# Altium schematic symbol library jlcpcb_2025_04_inductors_extended_0402.schlib: 1396 symbols (part 3 of 8) (continued)
## LQW15AN2N2B80D
designator L?  Inductance: 2.2nH
Inductor, 2.2nH, 22mΩ, SMD 0402; Manufacturer: Murata Electronics; Manufacturer Part Number: LQW15AN2N2B80D; Self-Resonant Frequency: 15.5GHz; Q Factor: 30@250MHz; Package Size: 0402; JLCPCB Basic Part: No; JLCPCB Part Number: C2041833; Supplier 1: LCSC; Category: Inductors; Supplier Part Number 1: C2041833; DC Resistance: 22mΩ; RoHS: Yes; ComponentLink1Description: Datasheet; ComponentLink1URL: https://wmsc.lcsc.com/wmsc/upload/file/pdf/v2/lcsc/2304140030_Murata-Electronics-LQW15AN2N2B80D_C2041833.pdf; ComponentLink2Description: JLCPCB Part URL; ComponentLink2URL: https://jlcpcb.com/partdetail/C2041833; ComponentLink3Description: LCSC Part URL; ComponentLink3URL: https://lcsc.com/product-detail/Inductors-SMD_Murata-Electronics-Murata-Electronics-LQW15AN2N2B80D_C2041833.html
footprint IND-0402 (0402 (1005M) Inductor)
pins: 1, 2

## LQW15AN2N2C8ZD
designator L?  Inductance: 2.2nH
Inductor, 2.2nH, 22mΩ, SMD 0402; Manufacturer: Murata Electronics; Manufacturer Part Number: LQW15AN2N2C8ZD; Self-Resonant Frequency: 15.5GHz; Q Factor: 30@250MHz; Package Size: 0402; JLCPCB Basic Part: No; JLCPCB Part Number: C883558; Supplier 1: LCSC; Category: Inductors; Supplier Part Number 1: C883558; DC Resistance: 22mΩ; RoHS: Yes; ComponentLink1Description: Datasheet; ComponentLink1URL: https://wmsc.lcsc.com/wmsc/upload/file/pdf/v2/lcsc/2304140030_Murata-Electronics-LQW15AN2N2C8ZD_C883558.pdf; ComponentLink2Description: JLCPCB Part URL; ComponentLink2URL: https://jlcpcb.com/partdetail/C883558; ComponentLink3Description: LCSC Part URL; ComponentLink3URL: https://lcsc.com/product-detail/Inductors-SMD_Murata-Electronics-Murata-Electronics-LQW15AN2N2C8ZD_C883558.html
footprint IND-0402 (0402 (1005M) Inductor)
pins: 1, 2

## LQW15AN2N2C10D
designator L?  Inductance: 2.2nH
Inductor, 2.2nH, 27mΩ, 1A, SMD 0402; Manufacturer: Murata Electronics; Manufacturer Part Number: LQW15AN2N2C10D; Self-Resonant Frequency: 14GHz; Q Factor: 25@250MHz; Package Size: 0402; JLCPCB Basic Part: No; JLCPCB Part Number: C91240; Supplier 1: LCSC; Category: Inductors; Supplier Part Number 1: C91240; Rated Current: 1A; DC Resistance: 27mΩ; RoHS: Yes; ComponentLink1Description: Datasheet; ComponentLink1URL: https://wmsc.lcsc.com/wmsc/upload/file/pdf/v2/lcsc/1811081515_Murata-Electronics-LQW15AN2N2C10D_C91240.pdf; ComponentLink2Description: JLCPCB Part URL; ComponentLink2URL: https://jlcpcb.com/partdetail/C91240; ComponentLink3Description: LCSC Part URL; ComponentLink3URL: https://lcsc.com/product-detail/Inductors-SMD_Murata-Electronics-Murata-Electronics-LQW15AN2N2C10D_C91240.html
footprint IND-0402 (0402 (1005M) Inductor)
pins: 1, 2

## LQW15AN2N2G80D
designator L?  Inductance: 2.2nH
Inductor, 2.2nH, ±2%, 22mΩ, 2.53A, SMD 0402; Manufacturer: Murata Electronics; Manufacturer Part Number: LQW15AN2N2G80D; Self-Resonant Frequency: 15.5GHz; Q Factor: 30@250MHz; Package Size: 0402; JLCPCB Basic Part: No; JLCPCB Part Number: C412264; Supplier 1: LCSC; Category: Inductors; Supplier Part Number 1: C412264; Tolerance: ±2%; Rated Current: 2.53A; DC Resistance: 22mΩ; RoHS: Yes; ComponentLink1Description: Datasheet; ComponentLink1URL: https://wmsc.lcsc.com/wmsc/upload/file/pdf/v2/lcsc/2304140030_Murata-Electronics-LQW15AN2N2G80D_C412264.pdf; ComponentLink2Description: JLCPCB Part URL; ComponentLink2URL: https://jlcpcb.com/partdetail/C412264; ComponentLink3Description: LCSC Part URL; ComponentLink3URL: https://lcsc.com/product-detail/Inductors-SMD_Murata-Electronics-Murata-Electronics-LQW15AN2N2G80D_C412264.html
footprint IND-0402 (0402 (1005M) Inductor)
pins: 1, 2

## LQW15AN2N3C10D
designator L?  Inductance: 2.3nH
Inductor, 2.3nH, 27mΩ, SMD 0402; Manufacturer: Murata Electronics; Manufacturer Part Number: LQW15AN2N3C10D; Self-Resonant Frequency: 14GHz; Q Factor: 25@250MHz; Package Size: 0402; JLCPCB Basic Part: No; JLCPCB Part Number: C412340; Supplier 1: LCSC; Category: Inductors; Supplier Part Number 1: C412340; DC Resistance: 27mΩ; RoHS: Yes; ComponentLink1Description: Datasheet; ComponentLink1URL: https://wmsc.lcsc.com/wmsc/upload/file/pdf/v2/lcsc/2304140030_Murata-Electronics-LQW15AN2N3C10D_C412340.pdf; ComponentLink2Description: JLCPCB Part URL; ComponentLink2URL: https://jlcpcb.com/partdetail/C412340; ComponentLink3Description: LCSC Part URL; ComponentLink3URL: https://lcsc.com/product-detail/Inductors-SMD_Murata-Electronics-Murata-Electronics-LQW15AN2N3C10D_C412340.html
footprint IND-0402 (0402 (1005M) Inductor)
pins: 1, 2

## LQW15AN2N4B00D
designator L?  Inductance: 2.4nH
Inductor, 2.4nH, 50mΩ, SMD 0402; Manufacturer: Murata Electronics; Manufacturer Part Number: LQW15AN2N4B00D; Self-Resonant Frequency: 15GHz; Q Factor: 20@250MHz; Package Size: 0402; JLCPCB Basic Part: No; JLCPCB Part Number: C113113; Supplier 1: LCSC; Category: Inductors; Supplier Part Number 1: C113113; DC Resistance: 50mΩ; RoHS: Yes; ComponentLink1Description: Datasheet; ComponentLink1URL: https://wmsc.lcsc.com/wmsc/upload/file/pdf/v2/lcsc/2304140030_Murata-Electronics-LQW15AN2N4B00D_C113113.pdf; ComponentLink2Description: JLCPCB Part URL; ComponentLink2URL: https://jlcpcb.com/partdetail/C113113; ComponentLink3Description: LCSC Part URL; ComponentLink3URL: https://lcsc.com/product-detail/Inductors-SMD_Murata-Electronics-Murata-Electronics-LQW15AN2N4B00D_C113113.html
footprint IND-0402 (0402 (1005M) Inductor)
pins: 1, 2

## LQW15AN2N4B80D
designator L?  Inductance: 2.4nH
Inductor, 2.4nH, 22mΩ, 2.53A, SMD 0402; Manufacturer: Murata Electronics; Manufacturer Part Number: LQW15AN2N4B80D; Package Size: 0402; JLCPCB Basic Part: No; JLCPCB Part Number: C3221977; Supplier 1: LCSC; Category: Inductors; Supplier Part Number 1: C3221977; Rated Current: 2.53A; DC Resistance: 22mΩ; RoHS: Yes; ComponentLink1Description: Datasheet; ComponentLink1URL: https://wmsc.lcsc.com/wmsc/upload/file/pdf/v2/lcsc/2308111552_Murata-Electronics-LQW15AN2N4B80D_C3221977.pdf; ComponentLink2Description: JLCPCB Part URL; ComponentLink2URL: https://jlcpcb.com/partdetail/C3221977; ComponentLink3Description: LCSC Part URL; ComponentLink3URL: https://lcsc.com/product-detail/Power-Inductors_Murata-Electronics-Murata-Electronics-LQW15AN2N4B80D_C3221977.html
footprint IND-0402 (0402 (1005M) Inductor)
pins: 1, 2

## LQW15AN2N4C00D
designator L?  Inductance: 2.4nH
Inductor, 2.4nH, 50mΩ, 850mA, SMD 0402; Manufacturer: Murata Electronics; Manufacturer Part Number: LQW15AN2N4C00D; Self-Resonant Frequency: 15GHz; Q Factor: 20@250MHz; Package Size: 0402; JLCPCB Basic Part: No; JLCPCB Part Number: C167473; Supplier 1: LCSC; Category: Inductors; Supplier Part Number 1: C167473; Rated Current: 850mA; DC Resistance: 50mΩ; RoHS: Yes; ComponentLink1Description: Datasheet; ComponentLink1URL: https://wmsc.lcsc.com/wmsc/upload/file/pdf/v2/lcsc/2304140030_Murata-Electronics-LQW15AN2N4C00D_C167473.pdf; ComponentLink2Description: JLCPCB Part URL; ComponentLink2URL: https://jlcpcb.com/partdetail/C167473; ComponentLink3Description: LCSC Part URL; ComponentLink3URL: https://lcsc.com/product-detail/Inductors-SMD_Murata-Electronics-Murata-Electronics-LQW15AN2N4C00D_C167473.html
footprint IND-0402 (0402 (1005M) Inductor)
pins: 1, 2

## LQW15AN2N4D00D
designator L?  Inductance: 2.4nH
Inductor, 2.4nH, 50mΩ, SMD 0402; Manufacturer: Murata Electronics; Manufacturer Part Number: LQW15AN2N4D00D; Self-Resonant Frequency: 15GHz; Q Factor: 20@250MHz; Package Size: 0402; JLCPCB Basic Part: No; JLCPCB Part Number: C435419; Supplier 1: LCSC; Category: Inductors; Supplier Part Number 1: C435419; DC Resistance: 50mΩ; RoHS: Yes; ComponentLink1Description: Datasheet; ComponentLink1URL: https://wmsc.lcsc.com/wmsc/upload/file/pdf/v2/lcsc/2304140030_Murata-Electronics-LQW15AN2N4D00D_C435419.pdf; ComponentLink2Description: JLCPCB Part URL; ComponentLink2URL: https://jlcpcb.com/partdetail/C435419; ComponentLink3Description: LCSC Part URL; ComponentLink3URL: https://lcsc.com/product-detail/Inductors-SMD_Murata-Electronics-Murata-Electronics-LQW15AN2N4D00D_C435419.html
footprint IND-0402 (0402 (1005M) Inductor)
pins: 1, 2

## LQW15AN2N4G80D
designator L?  Inductance: 2.4nH
Inductor, 2.4nH, ±2%, 22mΩ, SMD 0402; Manufacturer: Murata Electronics; Manufacturer Part Number: LQW15AN2N4G80D; Self-Resonant Frequency: 15.5GHz; Q Factor: 30@250MHz; Package Size: 0402; JLCPCB Basic Part: No; JLCPCB Part Number: C412266; Supplier 1: LCSC; Category: Inductors; Supplier Part Number 1: C412266; Tolerance: ±2%; DC Resistance: 22mΩ; RoHS: Yes; ComponentLink1Description: Datasheet; ComponentLink1URL: https://wmsc.lcsc.com/wmsc/upload/file/pdf/v2/lcsc/2304140030_Murata-Electronics-LQW15AN2N4G80D_C412266.pdf; ComponentLink2Description: JLCPCB Part URL; ComponentLink2URL: https://jlcpcb.com/partdetail/C412266; ComponentLink3Description: LCSC Part URL; ComponentLink3URL: https://lcsc.com/product-detail/Inductors-SMD_Murata-Electronics-Murata-Electronics-LQW15AN2N4G80D_C412266.html
footprint IND-0402 (0402 (1005M) Inductor)
pins: 1, 2

## LQW15AN2N5B00D
designator L?  Inductance: 2.5nH
Inductor, 2.5nH, 50mΩ, 850mA, SMD 0402; Manufacturer: Murata Electronics; Manufacturer Part Number: LQW15AN2N5B00D; Self-Resonant Frequency: 15GHz; Q Factor: 20@250MHz; Package Size: 0402; JLCPCB Basic Part: No; JLCPCB Part Number: C237342; Supplier 1: LCSC; Category: Inductors; Supplier Part Number 1: C237342; Rated Current: 850mA; DC Resistance: 50mΩ; RoHS: Yes; ComponentLink1Description: Datasheet; ComponentLink1URL: https://wmsc.lcsc.com/wmsc/upload/file/pdf/v2/lcsc/2304140030_Murata-Electronics-LQW15AN2N5B00D_C237342.pdf; ComponentLink2Description: JLCPCB Part URL; ComponentLink2URL: https://jlcpcb.com/partdetail/C237342; ComponentLink3Description: LCSC Part URL; ComponentLink3URL: https://lcsc.com/product-detail/Inductors-SMD_Murata-Electronics-Murata-Electronics-LQW15AN2N5B00D_C237342.html
footprint IND-0402 (0402 (1005M) Inductor)
pins: 1, 2

## LQW15AN2N5G80D
designator L?  Inductance: 2.5nH
Inductor, 2.5nH, ±2%, 30mΩ, 2.1A, SMD 0402; Manufacturer: Murata Electronics; Manufacturer Part Number: LQW15AN2N5G80D; Self-Resonant Frequency: 15.5GHz; Q Factor: 30@250MHz; Package Size: 0402; JLCPCB Basic Part: No; JLCPCB Part Number: C412267; Supplier 1: LCSC; Category: Inductors; Supplier Part Number 1: C412267; Tolerance: ±2%; Rated Current: 2.1A; DC Resistance: 30mΩ; RoHS: Yes; ComponentLink1Description: Datasheet; ComponentLink1URL: https://wmsc.lcsc.com/wmsc/upload/file/pdf/v2/lcsc/2304140030_Murata-Electronics-LQW15AN2N5G80D_C412267.pdf; ComponentLink2Description: JLCPCB Part URL; ComponentLink2URL: https://jlcpcb.com/partdetail/C412267; ComponentLink3Description: LCSC Part URL; ComponentLink3URL: https://lcsc.com/product-detail/Inductors-SMD_Murata-Electronics-Murata-Electronics-LQW15AN2N5G80D_C412267.html
footprint IND-0402 (0402 (1005M) Inductor)
pins: 1, 2

## LQW15AN2N6B8ZD
designator L?  Inductance: 2.6nH
Inductor, 2.6nH, 35mΩ, 1.95A, SMD 0402; Manufacturer: Murata Electronics; Manufacturer Part Number: LQW15AN2N6B8ZD; Package Size: 0402; JLCPCB Basic Part: No; JLCPCB Part Number: C2042110; Supplier 1: LCSC; Category: Inductors; Supplier Part Number 1: C2042110; Rated Current: 1.95A; DC Resistance: 35mΩ; RoHS: Yes; ComponentLink1Description: Datasheet; ComponentLink1URL: https://wmsc.lcsc.com/wmsc/upload/file/pdf/v2/lcsc/2304140030_Murata-Electronics-LQW15AN2N6B8ZD_C2042110.pdf; ComponentLink2Description: JLCPCB Part URL; ComponentLink2URL: https://jlcpcb.com/partdetail/C2042110; ComponentLink3Description: LCSC Part URL; ComponentLink3URL: https://lcsc.com/product-detail/Power-Inductors_Murata-Electronics-Murata-Electronics-LQW15AN2N6B8ZD_C2042110.html
footprint IND-0402 (0402 (1005M) Inductor)
pins: 1, 2

## LQW15AN2N6G80D
designator L?  Inductance: 2.6nH
Inductor, 2.6nH, ±2%, 35mΩ, SMD 0402; Manufacturer: Murata Electronics; Manufacturer Part Number: LQW15AN2N6G80D; Self-Resonant Frequency: 14.5GHz; Q Factor: 30@250MHz; Package Size: 0402; JLCPCB Basic Part: No; JLCPCB Part Number: C412268; Supplier 1: LCSC; Category: Inductors; Supplier Part Number 1: C412268; Tolerance: ±2%; DC Resistance: 35mΩ; RoHS: Yes; ComponentLink1Description: Datasheet; ComponentLink1URL: https://wmsc.lcsc.com/wmsc/upload/file/pdf/v2/lcsc/2304140030_Murata-Electronics-LQW15AN2N6G80D_C412268.pdf; ComponentLink2Description: JLCPCB Part URL; ComponentLink2URL: https://jlcpcb.com/partdetail/C412268; ComponentLink3Description: LCSC Part URL; ComponentLink3URL: https://lcsc.com/product-detail/Inductors-SMD_Murata-Electronics-Murata-Electronics-LQW15AN2N6G80D_C412268.html
footprint IND-0402 (0402 (1005M) Inductor)
pins: 1, 2

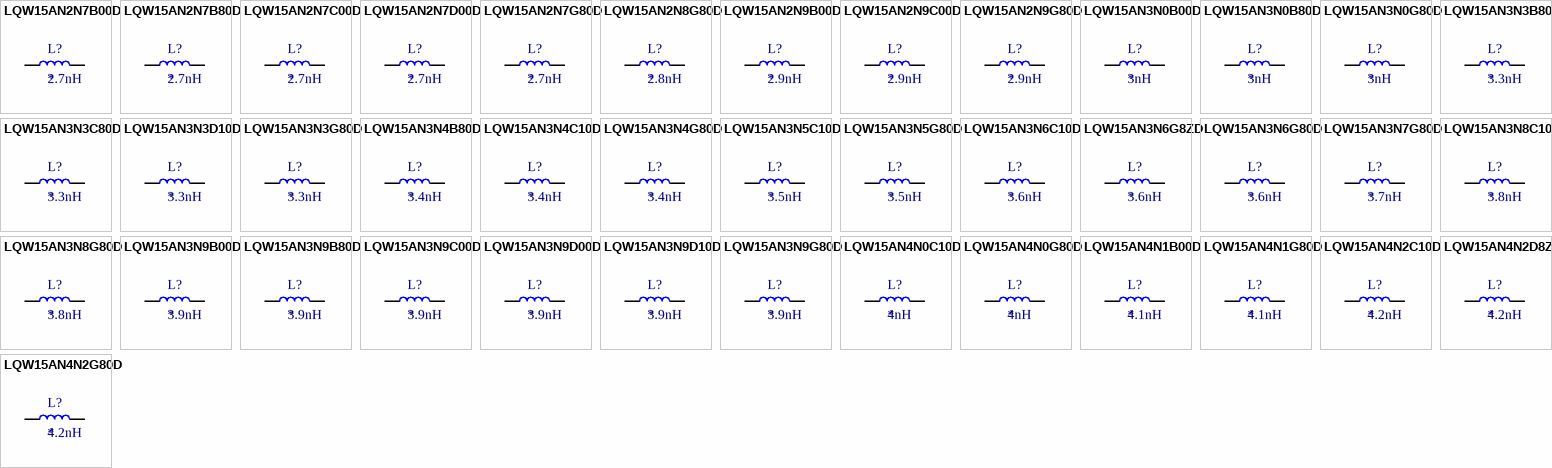
[diagram p12: symbols LQW15AN2N7B00D to LQW15AN4N2G80D]

## LQW15AN2N7B00D
designator L?  Inductance: 2.7nH
Inductor, 2.7nH, 50mΩ, 850mA, SMD 0402; Manufacturer: Murata Electronics; Manufacturer Part Number: LQW15AN2N7B00D; Self-Resonant Frequency: 15GHz; Q Factor: 20@250MHz; Package Size: 0402; JLCPCB Basic Part: No; JLCPCB Part Number: C91239; Supplier 1: LCSC; Category: Inductors; Supplier Part Number 1: C91239; Rated Current: 850mA; DC Resistance: 50mΩ; RoHS: Yes; ComponentLink1Description: Datasheet; ComponentLink1URL: https://wmsc.lcsc.com/wmsc/upload/file/pdf/v2/lcsc/1811081515_Murata-Electronics-LQW15AN2N7B00D_C91239.pdf; ComponentLink2Description: JLCPCB Part URL; ComponentLink2URL: https://jlcpcb.com/partdetail/C91239; ComponentLink3Description: LCSC Part URL; ComponentLink3URL: https://lcsc.com/product-detail/Inductors-SMD_Murata-Electronics-Murata-Electronics-LQW15AN2N7B00D_C91239.html
footprint IND-0402 (0402 (1005M) Inductor)
pins: 1, 2

## LQW15AN2N7B80D
designator L?  Inductance: 2.7nH
Inductor, 2.7nH, 47mΩ, 1.5A, SMD 0402; Manufacturer: Murata Electronics; Manufacturer Part Number: LQW15AN2N7B80D; Package Size: 0402; JLCPCB Basic Part: No; JLCPCB Part Number: C527595; Supplier 1: LCSC; Category: Inductors; Supplier Part Number 1: C527595; Rated Current: 1.5A; DC Resistance: 47mΩ; RoHS: Yes; ComponentLink1Description: Datasheet; ComponentLink1URL: https://wmsc.lcsc.com/wmsc/upload/file/pdf/v2/lcsc/2304140030_Murata-Electronics-LQW15AN2N7B80D_C527595.pdf; ComponentLink2Description: JLCPCB Part URL; ComponentLink2URL: https://jlcpcb.com/partdetail/C527595; ComponentLink3Description: LCSC Part URL; ComponentLink3URL: https://lcsc.com/product-detail/Power-Inductors_Murata-Electronics-Murata-Electronics-LQW15AN2N7B80D_C527595.html
footprint IND-0402 (0402 (1005M) Inductor)
pins: 1, 2

## LQW15AN2N7C00D
designator L?  Inductance: 2.7nH
Inductor, 2.7nH, 50mΩ, SMD 0402; Manufacturer: Murata Electronics; Manufacturer Part Number: LQW15AN2N7C00D; Self-Resonant Frequency: 15GHz; Q Factor: 20@250MHz; Package Size: 0402; JLCPCB Basic Part: No; JLCPCB Part Number: C98058; Supplier 1: LCSC; Category: Inductors; Supplier Part Number 1: C98058; DC Resistance: 50mΩ; RoHS: Yes; ComponentLink1Description: Datasheet; ComponentLink1URL: https://wmsc.lcsc.com/wmsc/upload/file/pdf/v2/lcsc/2304140030_Murata-Electronics-LQW15AN2N7C00D_C98058.pdf; ComponentLink2Description: JLCPCB Part URL; ComponentLink2URL: https://jlcpcb.com/partdetail/C98058; ComponentLink3Description: LCSC Part URL; ComponentLink3URL: https://lcsc.com/product-detail/Inductors-SMD_Murata-Electronics-Murata-Electronics-LQW15AN2N7C00D_C98058.html
footprint IND-0402 (0402 (1005M) Inductor)
pins: 1, 2

## LQW15AN2N7D00D
designator L?  Inductance: 2.7nH
Inductor, 2.7nH, 50mΩ, SMD 0402; Manufacturer: Murata Electronics; Manufacturer Part Number: LQW15AN2N7D00D; Self-Resonant Frequency: 15GHz; Q Factor: 20@250MHz; Package Size: 0402; JLCPCB Basic Part: No; JLCPCB Part Number: C337955; Supplier 1: LCSC; Category: Inductors; Supplier Part Number 1: C337955; DC Resistance: 50mΩ; RoHS: Yes; ComponentLink1Description: Datasheet; ComponentLink1URL: https://wmsc.lcsc.com/wmsc/upload/file/pdf/v2/lcsc/2304140030_Murata-Electronics-LQW15AN2N7D00D_C337955.pdf; ComponentLink2Description: JLCPCB Part URL; ComponentLink2URL: https://jlcpcb.com/partdetail/C337955; ComponentLink3Description: LCSC Part URL; ComponentLink3URL: https://lcsc.com/product-detail/Inductors-SMD_Murata-Electronics-Murata-Electronics-LQW15AN2N7D00D_C337955.html
footprint IND-0402 (0402 (1005M) Inductor)
pins: 1, 2

## LQW15AN2N7G80D
designator L?  Inductance: 2.7nH
Inductor, 2.7nH, ±2%, 47mΩ, SMD 0402; Manufacturer: Murata Electronics; Manufacturer Part Number: LQW15AN2N7G80D; Self-Resonant Frequency: 14GHz; Q Factor: 28@250MHz; Package Size: 0402; JLCPCB Basic Part: No; JLCPCB Part Number: C412269; Supplier 1: LCSC; Category: Inductors; Supplier Part Number 1: C412269; Tolerance: ±2%; DC Resistance: 47mΩ; RoHS: Yes; ComponentLink1Description: Datasheet; ComponentLink1URL: https://wmsc.lcsc.com/wmsc/upload/file/pdf/v2/lcsc/2304140030_Murata-Electronics-LQW15AN2N7G80D_C412269.pdf; ComponentLink2Description: JLCPCB Part URL; ComponentLink2URL: https://jlcpcb.com/partdetail/C412269; ComponentLink3Description: LCSC Part URL; ComponentLink3URL: https://lcsc.com/product-detail/Inductors-SMD_Murata-Electronics-Murata-Electronics-LQW15AN2N7G80D_C412269.html
footprint IND-0402 (0402 (1005M) Inductor)
pins: 1, 2

## LQW15AN2N8G80D
designator L?  Inductance: 2.8nH
Inductor, 2.8nH, ±2%, 47mΩ, SMD 0402; Manufacturer: Murata Electronics; Manufacturer Part Number: LQW15AN2N8G80D; Self-Resonant Frequency: 13.5GHz; Q Factor: 27@250MHz; Package Size: 0402; JLCPCB Basic Part: No; JLCPCB Part Number: C412270; Supplier 1: LCSC; Category: Inductors; Supplier Part Number 1: C412270; Tolerance: ±2%; DC Resistance: 47mΩ; RoHS: Yes; ComponentLink1Description: Datasheet; ComponentLink1URL: https://wmsc.lcsc.com/wmsc/upload/file/pdf/v2/lcsc/2304140030_Murata-Electronics-LQW15AN2N8G80D_C412270.pdf; ComponentLink2Description: JLCPCB Part URL; ComponentLink2URL: https://jlcpcb.com/partdetail/C412270; ComponentLink3Description: LCSC Part URL; ComponentLink3URL: https://lcsc.com/product-detail/Inductors-SMD_Murata-Electronics-Murata-Electronics-LQW15AN2N8G80D_C412270.html
footprint IND-0402 (0402 (1005M) Inductor)
pins: 1, 2

## LQW15AN2N9B00D
designator L?  Inductance: 2.9nH
Inductor, 2.9nH, 70mΩ, 750mA, SMD 0402; Manufacturer: Murata Electronics; Manufacturer Part Number: LQW15AN2N9B00D; Self-Resonant Frequency: 15GHz; Q Factor: 20@250MHz; Package Size: 0402; JLCPCB Basic Part: No; JLCPCB Part Number: C167474; Supplier 1: LCSC; Category: Inductors; Supplier Part Number 1: C167474; Rated Current: 750mA; DC Resistance: 70mΩ; RoHS: Yes; ComponentLink1Description: Datasheet; ComponentLink1URL: https://wmsc.lcsc.com/wmsc/upload/file/pdf/v2/lcsc/2304140030_Murata-Electronics-LQW15AN2N9B00D_C167474.pdf; ComponentLink2Description: JLCPCB Part URL; ComponentLink2URL: https://jlcpcb.com/partdetail/C167474; ComponentLink3Description: LCSC Part URL; ComponentLink3URL: https://lcsc.com/product-detail/Inductors-SMD_Murata-Electronics-Murata-Electronics-LQW15AN2N9B00D_C167474.html
footprint IND-0402 (0402 (1005M) Inductor)
pins: 1, 2

## LQW15AN2N9C00D
designator L?  Inductance: 2.9nH
Inductor, 2.9nH, 70mΩ, SMD 0402; Manufacturer: Murata Electronics; Manufacturer Part Number: LQW15AN2N9C00D; Self-Resonant Frequency: 15GHz; Q Factor: 20@250MHz; Package Size: 0402; JLCPCB Basic Part: No; JLCPCB Part Number: C167475; Supplier 1: LCSC; Category: Inductors; Supplier Part Number 1: C167475; DC Resistance: 70mΩ; RoHS: Yes; ComponentLink1Description: Datasheet; ComponentLink1URL: https://wmsc.lcsc.com/wmsc/upload/file/pdf/v2/lcsc/2304140030_Murata-Electronics-LQW15AN2N9C00D_C167475.pdf; ComponentLink2Description: JLCPCB Part URL; ComponentLink2URL: https://jlcpcb.com/partdetail/C167475; ComponentLink3Description: LCSC Part URL; ComponentLink3URL: https://lcsc.com/product-detail/Inductors-SMD_Murata-Electronics-Murata-Electronics-LQW15AN2N9C00D_C167475.html
footprint IND-0402 (0402 (1005M) Inductor)
pins: 1, 2

## LQW15AN2N9G80D
designator L?  Inductance: 2.9nH
Inductor, 2.9nH, ±2%, 47mΩ, SMD 0402; Manufacturer: Murata Electronics; Manufacturer Part Number: LQW15AN2N9G80D; Self-Resonant Frequency: 12.5GHz; Q Factor: 25@250MHz; Package Size: 0402; JLCPCB Basic Part: No; JLCPCB Part Number: C412271; Supplier 1: LCSC; Category: Inductors; Supplier Part Number 1: C412271; Tolerance: ±2%; DC Resistance: 47mΩ; RoHS: Yes; ComponentLink1Description: Datasheet; ComponentLink1URL: https://wmsc.lcsc.com/wmsc/upload/file/pdf/v2/lcsc/2304140030_Murata-Electronics-LQW15AN2N9G80D_C412271.pdf; ComponentLink2Description: JLCPCB Part URL; ComponentLink2URL: https://jlcpcb.com/partdetail/C412271; ComponentLink3Description: LCSC Part URL; ComponentLink3URL: https://lcsc.com/product-detail/Inductors-SMD_Murata-Electronics-Murata-Electronics-LQW15AN2N9G80D_C412271.html
footprint IND-0402 (0402 (1005M) Inductor)
pins: 1, 2

## LQW15AN3N0B00D
designator L?  Inductance: 3nH
Inductor, 3nH, 70mΩ, SMD 0402; Manufacturer: Murata Electronics; Manufacturer Part Number: LQW15AN3N0B00D; Self-Resonant Frequency: 15GHz; Q Factor: 20@250MHz; Package Size: 0402; JLCPCB Basic Part: No; JLCPCB Part Number: C269824; Supplier 1: LCSC; Category: Inductors; Supplier Part Number 1: C269824; DC Resistance: 70mΩ; RoHS: Yes; ComponentLink1Description: Datasheet; ComponentLink1URL: https://wmsc.lcsc.com/wmsc/upload/file/pdf/v2/lcsc/2304140030_Murata-Electronics-LQW15AN3N0B00D_C269824.pdf; ComponentLink2Description: JLCPCB Part URL; ComponentLink2URL: https://jlcpcb.com/partdetail/C269824; ComponentLink3Description: LCSC Part URL; ComponentLink3URL: https://lcsc.com/product-detail/Inductors-SMD_Murata-Electronics-Murata-Electronics-LQW15AN3N0B00D_C269824.html
footprint IND-0402 (0402 (1005M) Inductor)
pins: 1, 2

## LQW15AN3N0B80D
designator L?  Inductance: 3nH
Inductor, 3nH, 63mΩ, 1.35A, SMD 0402; Manufacturer: Murata Electronics; Manufacturer Part Number: LQW15AN3N0B80D; Self-Resonant Frequency: 12.5GHz; Q Factor: 20@250MHz; Package Size: 0402; JLCPCB Basic Part: No; JLCPCB Part Number: C2041661; Supplier 1: LCSC; Category: Inductors; Supplier Part Number 1: C2041661; Rated Current: 1.35A; DC Resistance: 63mΩ; RoHS: Yes; ComponentLink1Description: Datasheet; ComponentLink1URL: https://wmsc.lcsc.com/wmsc/upload/file/pdf/v2/lcsc/2304140030_Murata-Electronics-LQW15AN3N0B80D_C2041661.pdf; ComponentLink2Description: JLCPCB Part URL; ComponentLink2URL: https://jlcpcb.com/partdetail/C2041661; ComponentLink3Description: LCSC Part URL; ComponentLink3URL: https://lcsc.com/product-detail/Inductors-SMD_Murata-Electronics-Murata-Electronics-LQW15AN3N0B80D_C2041661.html
footprint IND-0402 (0402 (1005M) Inductor)
pins: 1, 2

## LQW15AN3N0G80D
designator L?  Inductance: 3nH
Inductor, 3nH, ±2%, 63mΩ, SMD 0402; Manufacturer: Murata Electronics; Manufacturer Part Number: LQW15AN3N0G80D; Self-Resonant Frequency: 12.5GHz; Q Factor: 20@250MHz; Package Size: 0402; JLCPCB Basic Part: No; JLCPCB Part Number: C412272; Supplier 1: LCSC; Category: Inductors; Supplier Part Number 1: C412272; Tolerance: ±2%; DC Resistance: 63mΩ; RoHS: Yes; ComponentLink1Description: Datasheet; ComponentLink1URL: https://wmsc.lcsc.com/wmsc/upload/file/pdf/v2/lcsc/2304140030_Murata-Electronics-LQW15AN3N0G80D_C412272.pdf; ComponentLink2Description: JLCPCB Part URL; ComponentLink2URL: https://jlcpcb.com/partdetail/C412272; ComponentLink3Description: LCSC Part URL; ComponentLink3URL: https://lcsc.com/product-detail/Inductors-SMD_Murata-Electronics-Murata-Electronics-LQW15AN3N0G80D_C412272.html
footprint IND-0402 (0402 (1005M) Inductor)
pins: 1, 2

## LQW15AN3N3B80D
designator L?  Inductance: 3.3nH
Inductor, 3.3nH, 30mΩ, SMD 0402; Manufacturer: Murata Electronics; Manufacturer Part Number: LQW15AN3N3B80D; Self-Resonant Frequency: 14GHz; Q Factor: 30@250MHz; Package Size: 0402; JLCPCB Basic Part: No; JLCPCB Part Number: C341785; Supplier 1: LCSC; Category: Inductors; Supplier Part Number 1: C341785; DC Resistance: 30mΩ; RoHS: Yes; ComponentLink1Description: Datasheet; ComponentLink1URL: https://wmsc.lcsc.com/wmsc/upload/file/pdf/v2/lcsc/2304140030_Murata-Electronics-LQW15AN3N3B80D_C341785.pdf; ComponentLink2Description: JLCPCB Part URL; ComponentLink2URL: https://jlcpcb.com/partdetail/C341785; ComponentLink3Description: LCSC Part URL; ComponentLink3URL: https://lcsc.com/product-detail/Inductors-SMD_Murata-Electronics-Murata-Electronics-LQW15AN3N3B80D_C341785.html
footprint IND-0402 (0402 (1005M) Inductor)
pins: 1, 2

## LQW15AN3N3C80D
designator L?  Inductance: 3.3nH
Inductor, 3.3nH, 30mΩ, SMD 0402; Manufacturer: Murata Electronics; Manufacturer Part Number: LQW15AN3N3C80D; Self-Resonant Frequency: 14GHz; Q Factor: 30@250MHz; Package Size: 0402; JLCPCB Basic Part: No; JLCPCB Part Number: C237574; Supplier 1: LCSC; Category: Inductors; Supplier Part Number 1: C237574; DC Resistance: 30mΩ; RoHS: Yes; ComponentLink1Description: Datasheet; ComponentLink1URL: https://wmsc.lcsc.com/wmsc/upload/file/pdf/v2/lcsc/2304140030_Murata-Electronics-LQW15AN3N3C80D_C237574.pdf; ComponentLink2Description: JLCPCB Part URL; ComponentLink2URL: https://jlcpcb.com/partdetail/C237574; ComponentLink3Description: LCSC Part URL; ComponentLink3URL: https://lcsc.com/product-detail/Inductors-SMD_Murata-Electronics-Murata-Electronics-LQW15AN3N3C80D_C237574.html
footprint IND-0402 (0402 (1005M) Inductor)
pins: 1, 2

## LQW15AN3N3D10D
designator L?  Inductance: 3.3nH
Inductor, 3.3nH, 40mΩ, 900mA, SMD 0402; Manufacturer: Murata Electronics; Manufacturer Part Number: LQW15AN3N3D10D; Self-Resonant Frequency: 12GHz; Q Factor: 30@250MHz; Package Size: 0402; JLCPCB Basic Part: No; JLCPCB Part Number: C98061; Supplier 1: LCSC; Category: Inductors; Supplier Part Number 1: C98061; Rated Current: 900mA; DC Resistance: 40mΩ; RoHS: Yes; ComponentLink1Description: Datasheet; ComponentLink1URL: https://wmsc.lcsc.com/wmsc/upload/file/pdf/v2/lcsc/2304140030_Murata-Electronics-LQW15AN3N3D10D_C98061.pdf; ComponentLink2Description: JLCPCB Part URL; ComponentLink2URL: https://jlcpcb.com/partdetail/C98061; ComponentLink3Description: LCSC Part URL; ComponentLink3URL: https://lcsc.com/product-detail/Inductors-SMD_Murata-Electronics-Murata-Electronics-LQW15AN3N3D10D_C98061.html
footprint IND-0402 (0402 (1005M) Inductor)
pins: 1, 2

## LQW15AN3N3G80D
designator L?  Inductance: 3.3nH
Inductor, 3.3nH, ±2%, 30mΩ, SMD 0402; Manufacturer: Murata Electronics; Manufacturer Part Number: LQW15AN3N3G80D; Self-Resonant Frequency: 14GHz; Q Factor: 30@250MHz; Package Size: 0402; JLCPCB Basic Part: No; JLCPCB Part Number: C412273; Supplier 1: LCSC; Category: Inductors; Supplier Part Number 1: C412273; Tolerance: ±2%; DC Resistance: 30mΩ; RoHS: Yes; ComponentLink1Description: Datasheet; ComponentLink1URL: https://wmsc.lcsc.com/wmsc/upload/file/pdf/v2/lcsc/2304140030_Murata-Electronics-LQW15AN3N3G80D_C412273.pdf; ComponentLink2Description: JLCPCB Part URL; ComponentLink2URL: https://jlcpcb.com/partdetail/C412273; ComponentLink3Description: LCSC Part URL; ComponentLink3URL: https://lcsc.com/product-detail/Inductors-SMD_Murata-Electronics-Murata-Electronics-LQW15AN3N3G80D_C412273.html
footprint IND-0402 (0402 (1005M) Inductor)
pins: 1, 2

## LQW15AN3N4B80D
designator L?  Inductance: 3.4nH
Inductor, 3.4nH, 30mΩ, 1.95A, SMD 0402; Manufacturer: Murata Electronics; Manufacturer Part Number: LQW15AN3N4B80D; Self-Resonant Frequency: 10GHz; Q Factor: 30@250MHz; Package Size: 0402; JLCPCB Basic Part: No; JLCPCB Part Number: C471377; Supplier 1: LCSC; Category: Inductors; Supplier Part Number 1: C471377; Rated Current: 1.95A; DC Resistance: 30mΩ; RoHS: Yes; ComponentLink1Description: Datasheet; ComponentLink1URL: https://wmsc.lcsc.com/wmsc/upload/file/pdf/v2/lcsc/2304140030_Murata-Electronics-LQW15AN3N4B80D_C471377.pdf; ComponentLink2Description: JLCPCB Part URL; ComponentLink2URL: https://jlcpcb.com/partdetail/C471377; ComponentLink3Description: LCSC Part URL; ComponentLink3URL: https://lcsc.com/product-detail/Inductors-SMD_Murata-Electronics-Murata-Electronics-LQW15AN3N4B80D_C471377.html
footprint IND-0402 (0402 (1005M) Inductor)
pins: 1, 2

## LQW15AN3N4C10D
designator L?  Inductance: 3.4nH
Inductor, 3.4nH, 40mΩ, SMD 0402; Manufacturer: Murata Electronics; Manufacturer Part Number: LQW15AN3N4C10D; Self-Resonant Frequency: 12GHz; Q Factor: 30@250MHz; Package Size: 0402; JLCPCB Basic Part: No; JLCPCB Part Number: C91624; Supplier 1: LCSC; Category: Inductors; Supplier Part Number 1: C91624; DC Resistance: 40mΩ; RoHS: Yes; ComponentLink1Description: Datasheet; ComponentLink1URL: https://wmsc.lcsc.com/wmsc/upload/file/pdf/v2/lcsc/1811081524_Murata-Electronics-LQW15AN3N4C10D_C91624.pdf; ComponentLink2Description: JLCPCB Part URL; ComponentLink2URL: https://jlcpcb.com/partdetail/C91624; ComponentLink3Description: LCSC Part URL; ComponentLink3URL: https://lcsc.com/product-detail/Inductors-SMD_Murata-Electronics-Murata-Electronics-LQW15AN3N4C10D_C91624.html
footprint IND-0402 (0402 (1005M) Inductor)
pins: 1, 2

## LQW15AN3N4G80D
designator L?  Inductance: 3.4nH
Inductor, 3.4nH, ±2%, 30mΩ, SMD 0402; Manufacturer: Murata Electronics; Manufacturer Part Number: LQW15AN3N4G80D; Self-Resonant Frequency: 10GHz; Q Factor: 30@250MHz; Package Size: 0402; JLCPCB Basic Part: No; JLCPCB Part Number: C412274; Supplier 1: LCSC; Category: Inductors; Supplier Part Number 1: C412274; Tolerance: ±2%; DC Resistance: 30mΩ; RoHS: Yes; ComponentLink1Description: Datasheet; ComponentLink1URL: https://wmsc.lcsc.com/wmsc/upload/file/pdf/v2/lcsc/2304140030_Murata-Electronics-LQW15AN3N4G80D_C412274.pdf; ComponentLink2Description: JLCPCB Part URL; ComponentLink2URL: https://jlcpcb.com/partdetail/C412274; ComponentLink3Description: LCSC Part URL; ComponentLink3URL: https://lcsc.com/product-detail/Inductors-SMD_Murata-Electronics-Murata-Electronics-LQW15AN3N4G80D_C412274.html
footprint IND-0402 (0402 (1005M) Inductor)
pins: 1, 2

## LQW15AN3N5C10D
designator L?  Inductance: 3.5nH
Inductor, 3.5nH, 40mΩ, SMD 0402; Manufacturer: Murata Electronics; Manufacturer Part Number: LQW15AN3N5C10D; Self-Resonant Frequency: 9.5GHz; Q Factor: 30@250MHz; Package Size: 0402; JLCPCB Basic Part: No; JLCPCB Part Number: C412342; Supplier 1: LCSC; Category: Inductors; Supplier Part Number 1: C412342; DC Resistance: 40mΩ; RoHS: Yes; ComponentLink1Description: Datasheet; ComponentLink1URL: https://wmsc.lcsc.com/wmsc/upload/file/pdf/v2/lcsc/2304140030_Murata-Electronics-LQW15AN3N5C10D_C412342.pdf; ComponentLink2Description: JLCPCB Part URL; ComponentLink2URL: https://jlcpcb.com/partdetail/C412342; ComponentLink3Description: LCSC Part URL; ComponentLink3URL: https://lcsc.com/product-detail/Inductors-SMD_Murata-Electronics-Murata-Electronics-LQW15AN3N5C10D_C412342.html
footprint IND-0402 (0402 (1005M) Inductor)
pins: 1, 2

## LQW15AN3N5G80D
designator L?  Inductance: 3.5nH
Inductor, 3.5nH, ±2%, 30mΩ, SMD 0402; Manufacturer: Murata Electronics; Manufacturer Part Number: LQW15AN3N5G80D; Self-Resonant Frequency: 10GHz; Q Factor: 30@250MHz; Package Size: 0402; JLCPCB Basic Part: No; JLCPCB Part Number: C412275; Supplier 1: LCSC; Category: Inductors; Supplier Part Number 1: C412275; Tolerance: ±2%; DC Resistance: 30mΩ; RoHS: Yes; ComponentLink1Description: Datasheet; ComponentLink1URL: https://wmsc.lcsc.com/wmsc/upload/file/pdf/v2/lcsc/2304140030_Murata-Electronics-LQW15AN3N5G80D_C412275.pdf; ComponentLink2Description: JLCPCB Part URL; ComponentLink2URL: https://jlcpcb.com/partdetail/C412275; ComponentLink3Description: LCSC Part URL; ComponentLink3URL: https://lcsc.com/product-detail/Inductors-SMD_Murata-Electronics-Murata-Electronics-LQW15AN3N5G80D_C412275.html
footprint IND-0402 (0402 (1005M) Inductor)
pins: 1, 2

## LQW15AN3N6C10D
designator L?  Inductance: 3.6nH
Inductor, 3.6nH, 40mΩ, SMD 0402; Manufacturer: Murata Electronics; Manufacturer Part Number: LQW15AN3N6C10D; Self-Resonant Frequency: 9.5GHz; Q Factor: 30@250MHz; Package Size: 0402; JLCPCB Basic Part: No; JLCPCB Part Number: C408158; Supplier 1: LCSC; Category: Inductors; Supplier Part Number 1: C408158; DC Resistance: 40mΩ; RoHS: Yes; ComponentLink1Description: Datasheet; ComponentLink1URL: https://wmsc.lcsc.com/wmsc/upload/file/pdf/v2/lcsc/2304140030_Murata-Electronics-LQW15AN3N6C10D_C408158.pdf; ComponentLink2Description: JLCPCB Part URL; ComponentLink2URL: https://jlcpcb.com/partdetail/C408158; ComponentLink3Description: LCSC Part URL; ComponentLink3URL: https://lcsc.com/product-detail/Inductors-SMD_Murata-Electronics-Murata-Electronics-LQW15AN3N6C10D_C408158.html
footprint IND-0402 (0402 (1005M) Inductor)
pins: 1, 2

## LQW15AN3N6G8ZD
designator L?  Inductance: 3.6nH
Inductor, 3.6nH, ±2%, 30mΩ, 1.95A, SMD 0402; Manufacturer: Murata Electronics; Manufacturer Part Number: LQW15AN3N6G8ZD; Self-Resonant Frequency: 10GHz; Q Factor: 30@250MHz; Package Size: 0402; JLCPCB Basic Part: No; JLCPCB Part Number: C1330569; Supplier 1: LCSC; Category: Inductors; Supplier Part Number 1: C1330569; Tolerance: ±2%; Rated Current: 1.95A; DC Resistance: 30mΩ; RoHS: Yes; ComponentLink1Description: Datasheet; ComponentLink1URL: https://wmsc.lcsc.com/wmsc/upload/file/pdf/v2/lcsc/2304140030_Murata-Electronics-LQW15AN3N6G8ZD_C1330569.pdf; ComponentLink2Description: JLCPCB Part URL; ComponentLink2URL: https://jlcpcb.com/partdetail/C1330569; ComponentLink3Description: LCSC Part URL; ComponentLink3URL: https://lcsc.com/product-detail/Inductors-SMD_Murata-Electronics-Murata-Electronics-LQW15AN3N6G8ZD_C1330569.html
footprint IND-0402 (0402 (1005M) Inductor)
pins: 1, 2

## LQW15AN3N6G80D
designator L?  Inductance: 3.6nH
Inductor, 3.6nH, ±2%, 30mΩ, SMD 0402; Manufacturer: Murata Electronics; Manufacturer Part Number: LQW15AN3N6G80D; Self-Resonant Frequency: 10GHz; Q Factor: 30@250MHz; Package Size: 0402; JLCPCB Basic Part: No; JLCPCB Part Number: C412276; Supplier 1: LCSC; Category: Inductors; Supplier Part Number 1: C412276; Tolerance: ±2%; DC Resistance: 30mΩ; RoHS: Yes; ComponentLink1Description: Datasheet; ComponentLink1URL: https://wmsc.lcsc.com/wmsc/upload/file/pdf/v2/lcsc/2304140030_Murata-Electronics-LQW15AN3N6G80D_C412276.pdf; ComponentLink2Description: JLCPCB Part URL; ComponentLink2URL: https://jlcpcb.com/partdetail/C412276; ComponentLink3Description: LCSC Part URL; ComponentLink3URL: https://lcsc.com/product-detail/Inductors-SMD_Murata-Electronics-Murata-Electronics-LQW15AN3N6G80D_C412276.html
footprint IND-0402 (0402 (1005M) Inductor)
pins: 1, 2

## LQW15AN3N7G80D
designator L?  Inductance: 3.7nH
Inductor, 3.7nH, ±2%, 30mΩ, SMD 0402; Manufacturer: Murata Electronics; Manufacturer Part Number: LQW15AN3N7G80D; Self-Resonant Frequency: 10GHz; Q Factor: 35@250MHz; Package Size: 0402; JLCPCB Basic Part: No; JLCPCB Part Number: C412277; Supplier 1: LCSC; Category: Inductors; Supplier Part Number 1: C412277; Tolerance: ±2%; DC Resistance: 30mΩ; RoHS: Yes; ComponentLink1Description: Datasheet; ComponentLink1URL: https://wmsc.lcsc.com/wmsc/upload/file/pdf/v2/lcsc/2304140030_Murata-Electronics-LQW15AN3N7G80D_C412277.pdf; ComponentLink2Description: JLCPCB Part URL; ComponentLink2URL: https://jlcpcb.com/partdetail/C412277; ComponentLink3Description: LCSC Part URL; ComponentLink3URL: https://lcsc.com/product-detail/Inductors-SMD_Murata-Electronics-Murata-Electronics-LQW15AN3N7G80D_C412277.html
footprint IND-0402 (0402 (1005M) Inductor)
pins: 1, 2

## LQW15AN3N8C10D
designator L?  Inductance: 3.8nH
Inductor, 3.8nH, 40mΩ, SMD 0402; Manufacturer: Murata Electronics; Manufacturer Part Number: LQW15AN3N8C10D; Self-Resonant Frequency: 7GHz; Q Factor: 30@250MHz; Package Size: 0402; JLCPCB Basic Part: No; JLCPCB Part Number: C412343; Supplier 1: LCSC; Category: Inductors; Supplier Part Number 1: C412343; DC Resistance: 40mΩ; RoHS: Yes; ComponentLink1Description: Datasheet; ComponentLink1URL: https://wmsc.lcsc.com/wmsc/upload/file/pdf/v2/lcsc/2304140030_Murata-Electronics-LQW15AN3N8C10D_C412343.pdf; ComponentLink2Description: JLCPCB Part URL; ComponentLink2URL: https://jlcpcb.com/partdetail/C412343; ComponentLink3Description: LCSC Part URL; ComponentLink3URL: https://lcsc.com/product-detail/Inductors-SMD_Murata-Electronics-Murata-Electronics-LQW15AN3N8C10D_C412343.html
footprint IND-0402 (0402 (1005M) Inductor)
pins: 1, 2

## LQW15AN3N8G80D
designator L?  Inductance: 3.8nH
Inductor, 3.8nH, ±2%, 30mΩ, SMD 0402; Manufacturer: Murata Electronics; Manufacturer Part Number: LQW15AN3N8G80D; Self-Resonant Frequency: 10GHz; Q Factor: 35@250MHz; Package Size: 0402; JLCPCB Basic Part: No; JLCPCB Part Number: C412278; Supplier 1: LCSC; Category: Inductors; Supplier Part Number 1: C412278; Tolerance: ±2%; DC Resistance: 30mΩ; RoHS: Yes; ComponentLink1Description: Datasheet; ComponentLink1URL: https://wmsc.lcsc.com/wmsc/upload/file/pdf/v2/lcsc/2304140030_Murata-Electronics-LQW15AN3N8G80D_C412278.pdf; ComponentLink2Description: JLCPCB Part URL; ComponentLink2URL: https://jlcpcb.com/partdetail/C412278; ComponentLink3Description: LCSC Part URL; ComponentLink3URL: https://lcsc.com/product-detail/Inductors-SMD_Murata-Electronics-Murata-Electronics-LQW15AN3N8G80D_C412278.html
footprint IND-0402 (0402 (1005M) Inductor)
pins: 1, 2

## LQW15AN3N9B00D
designator L?  Inductance: 3.9nH
Inductor, 3.9nH, 70mΩ, 750mA, SMD 0402; Manufacturer: Murata Electronics; Manufacturer Part Number: LQW15AN3N9B00D; Self-Resonant Frequency: 10GHz; Q Factor: 25@250MHz; Package Size: 0402; JLCPCB Basic Part: No; JLCPCB Part Number: C98062; Supplier 1: LCSC; Category: Inductors; Supplier Part Number 1: C98062; Rated Current: 750mA; DC Resistance: 70mΩ; RoHS: Yes; ComponentLink1Description: Datasheet; ComponentLink1URL: https://wmsc.lcsc.com/wmsc/upload/file/pdf/v2/lcsc/2304140030_Murata-Electronics-LQW15AN3N9B00D_C98062.pdf; ComponentLink2Description: JLCPCB Part URL; ComponentLink2URL: https://jlcpcb.com/partdetail/C98062; ComponentLink3Description: LCSC Part URL; ComponentLink3URL: https://lcsc.com/product-detail/Inductors-SMD_Murata-Electronics-Murata-Electronics-LQW15AN3N9B00D_C98062.html
footprint IND-0402 (0402 (1005M) Inductor)
pins: 1, 2

## LQW15AN3N9B80D
designator L?  Inductance: 3.9nH
Inductor, 3.9nH, 30mΩ, SMD 0402; Manufacturer: Murata Electronics; Manufacturer Part Number: LQW15AN3N9B80D; Self-Resonant Frequency: 10GHz; Q Factor: 35@250MHz; Package Size: 0402; JLCPCB Basic Part: No; JLCPCB Part Number: C1329507; Supplier 1: LCSC; Category: Inductors; Supplier Part Number 1: C1329507; DC Resistance: 30mΩ; RoHS: Yes; ComponentLink1Description: Datasheet; ComponentLink1URL: https://wmsc.lcsc.com/wmsc/upload/file/pdf/v2/lcsc/2304140030_Murata-Electronics-LQW15AN3N9B80D_C1329507.pdf; ComponentLink2Description: JLCPCB Part URL; ComponentLink2URL: https://jlcpcb.com/partdetail/C1329507; ComponentLink3Description: LCSC Part URL; ComponentLink3URL: https://lcsc.com/product-detail/Inductors-SMD_Murata-Electronics-Murata-Electronics-LQW15AN3N9B80D_C1329507.html
footprint IND-0402 (0402 (1005M) Inductor)
pins: 1, 2

## LQW15AN3N9C00D
designator L?  Inductance: 3.9nH
Inductor, 3.9nH, 70mΩ, SMD 0402; Manufacturer: Murata Electronics; Manufacturer Part Number: LQW15AN3N9C00D; Self-Resonant Frequency: 10GHz; Q Factor: 25@250MHz; Package Size: 0402; JLCPCB Basic Part: No; JLCPCB Part Number: C98063; Supplier 1: LCSC; Category: Inductors; Supplier Part Number 1: C98063; DC Resistance: 70mΩ; RoHS: Yes; ComponentLink1Description: Datasheet; ComponentLink1URL: https://wmsc.lcsc.com/wmsc/upload/file/pdf/v2/lcsc/2304140030_Murata-Electronics-LQW15AN3N9C00D_C98063.pdf; ComponentLink2Description: JLCPCB Part URL; ComponentLink2URL: https://jlcpcb.com/partdetail/C98063; ComponentLink3Description: LCSC Part URL; ComponentLink3URL: https://lcsc.com/product-detail/Inductors-SMD_Murata-Electronics-Murata-Electronics-LQW15AN3N9C00D_C98063.html
footprint IND-0402 (0402 (1005M) Inductor)
pins: 1, 2

## LQW15AN3N9D00D
designator L?  Inductance: 3.9nH
Inductor, 3.9nH, 70mΩ, 750mA, SMD 0402; Manufacturer: Murata Electronics; Manufacturer Part Number: LQW15AN3N9D00D; Package Size: 0402; JLCPCB Basic Part: No; JLCPCB Part Number: C703093; Supplier 1: LCSC; Category: Inductors; Supplier Part Number 1: C703093; Rated Current: 750mA; DC Resistance: 70mΩ; RoHS: Yes; ComponentLink1Description: Datasheet; ComponentLink1URL: https://wmsc.lcsc.com/wmsc/upload/file/pdf/v2/lcsc/2304140030_Murata-Electronics-LQW15AN3N9D00D_C703093.pdf; ComponentLink2Description: JLCPCB Part URL; ComponentLink2URL: https://jlcpcb.com/partdetail/C703093; ComponentLink3Description: LCSC Part URL; ComponentLink3URL: https://lcsc.com/product-detail/Power-Inductors_Murata-Electronics-Murata-Electronics-LQW15AN3N9D00D_C703093.html
footprint IND-0402 (0402 (1005M) Inductor)
pins: 1, 2

## LQW15AN3N9D10D
designator L?  Inductance: 3.9nH
Inductor, 3.9nH, 40mΩ, 900mA, SMD 0402; Manufacturer: Murata Electronics; Manufacturer Part Number: LQW15AN3N9D10D; Self-Resonant Frequency: 7GHz; Q Factor: 30@250MHz; Package Size: 0402; JLCPCB Basic Part: No; JLCPCB Part Number: C412344; Supplier 1: LCSC; Category: Inductors; Supplier Part Number 1: C412344; Rated Current: 900mA; DC Resistance: 40mΩ; RoHS: Yes; ComponentLink1Description: Datasheet; ComponentLink1URL: https://wmsc.lcsc.com/wmsc/upload/file/pdf/v2/lcsc/2304140030_Murata-Electronics-LQW15AN3N9D10D_C412344.pdf; ComponentLink2Description: JLCPCB Part URL; ComponentLink2URL: https://jlcpcb.com/partdetail/C412344; ComponentLink3Description: LCSC Part URL; ComponentLink3URL: https://lcsc.com/product-detail/Inductors-SMD_Murata-Electronics-Murata-Electronics-LQW15AN3N9D10D_C412344.html
footprint IND-0402 (0402 (1005M) Inductor)
pins: 1, 2

## LQW15AN3N9G80D
designator L?  Inductance: 3.9nH
Inductor, 3.9nH, ±2%, 30mΩ, SMD 0402; Manufacturer: Murata Electronics; Manufacturer Part Number: LQW15AN3N9G80D; Self-Resonant Frequency: 10GHz; Q Factor: 35@250MHz; Package Size: 0402; JLCPCB Basic Part: No; JLCPCB Part Number: C412279; Supplier 1: LCSC; Category: Inductors; Supplier Part Number 1: C412279; Tolerance: ±2%; DC Resistance: 30mΩ; RoHS: Yes; ComponentLink1Description: Datasheet; ComponentLink1URL: https://wmsc.lcsc.com/wmsc/upload/file/pdf/v2/lcsc/2304140030_Murata-Electronics-LQW15AN3N9G80D_C412279.pdf; ComponentLink2Description: JLCPCB Part URL; ComponentLink2URL: https://jlcpcb.com/partdetail/C412279; ComponentLink3Description: LCSC Part URL; ComponentLink3URL: https://lcsc.com/product-detail/Inductors-SMD_Murata-Electronics-Murata-Electronics-LQW15AN3N9G80D_C412279.html
footprint IND-0402 (0402 (1005M) Inductor)
pins: 1, 2
